# Altium integrated library controller.IntLib: 49 symbols
Pins are listed as number, name and electrical type; pins without a type are passive.

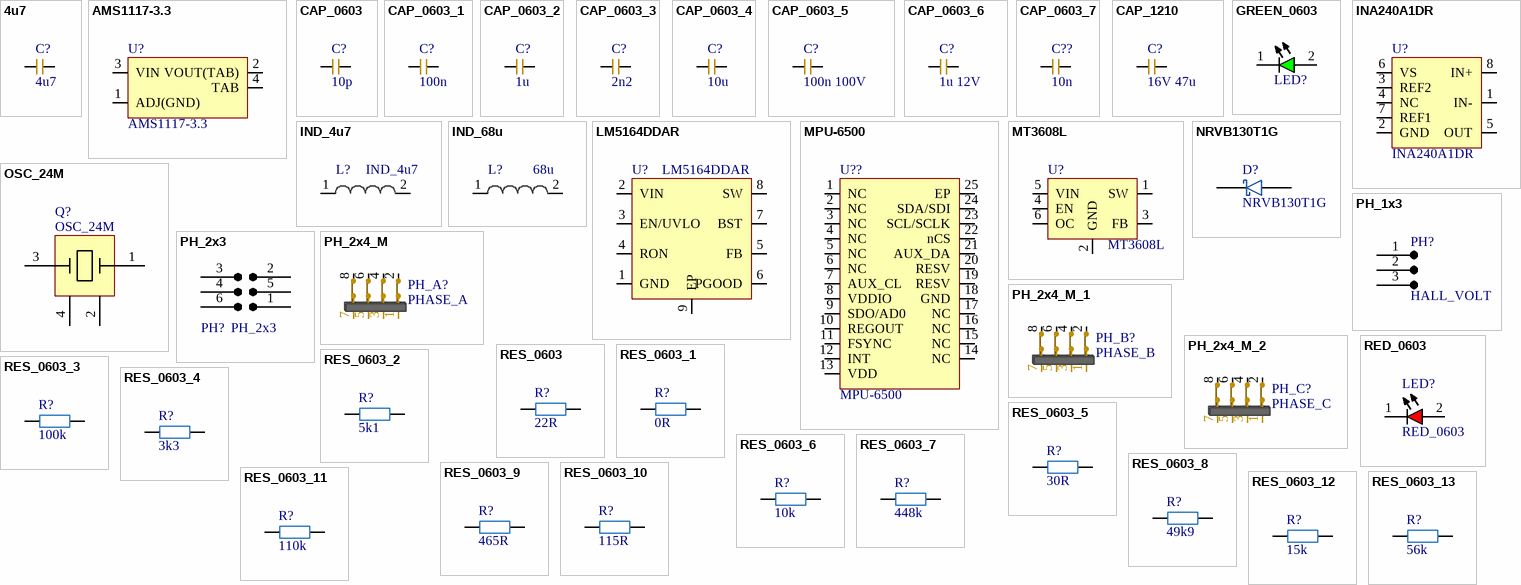
[diagram p0: symbols 4u7 to RES_0603_13]

## 4u7
designator C?
100V 4.7uF X7R ±10% 1210 Multilayer Ceramic Capacitors MLCC - SMD/SMT ROHS; Mfr.: PSA(Prosperity Dielectrics); Mfr. Part: FS32X475K101EGG; Voltage Rating: 100V; Package: 1210; LCSC: C381466; ClassName: DCDC100
footprint FS32X475K101EGG (100V 4.7uF X7R ±10% 1210 Multilayer Ceramic Capacitors MLCC - SMD/SMT ROHS)
pins: 1, 2

## AMS1117-3.3
designator U?
1A 60dB@(120Hz) Fixed 3.3V Positive electrode 12V SOT-223 Voltage Regulators - Linear, Low Drop Out (LDO) Regulators ROHS; Mfr.: UMW(Youtai Semiconductor Co., Ltd.); Mfr. Part: AMS1117-3.3; LCSC: C347222; ClassName: LINREG
footprint AMS1117-3.3 (1A 60dB@(120Hz) Fixed 3.3V Positive electrode 12V SOT-223 Voltage Regulators - Linear, Low Drop Out (LDO) Regulators ROHS)
pins: 1 ADJ(GND), 2 VOUT(TAB), 3 VIN, 4 TAB

## CAP_0603
designator C?, comment 10p
Multilayer Ceramic Capacitors MLCC - SMD/SMT ROHS; Mfr.: *; Voltage Rating: *; Package: 0603; LCSC: *; Mfr. Part: *
footprint CAP_0603
pins: 1, 2

## CAP_0603_1
designator C?, comment 100n
Multilayer Ceramic Capacitors MLCC - SMD/SMT ROHS; Mfr.: *; Voltage Rating: *; Package: 0603; LCSC: *; Mfr. Part: *
footprint CAP_0603
pins: 1, 2

## CAP_0603_2
designator C?, comment 1u
Multilayer Ceramic Capacitors MLCC - SMD/SMT ROHS; Mfr.: *; Voltage Rating: *; Package: 0603; LCSC: *; Mfr. Part: *
footprint CAP_0603
pins: 1, 2

## CAP_0603_3
designator C?, comment 2n2
Multilayer Ceramic Capacitors MLCC - SMD/SMT ROHS; Mfr.: *; Voltage Rating: *; Package: 0603; LCSC: *; Mfr. Part: *; ClassName: DCDC100
footprint CAP_0603
pins: 1, 2

## CAP_0603_4
designator C?, comment 10u
Multilayer Ceramic Capacitors MLCC - SMD/SMT ROHS; Mfr.: *; Voltage Rating: *; Package: 0603; LCSC: *; Mfr. Part: *; ClassName: LINREG
footprint CAP_0603
pins: 1, 2

## CAP_0603_5
designator C?, comment 100n 100V
Multilayer Ceramic Capacitors MLCC - SMD/SMT ROHS; Mfr.: *; Voltage Rating: *; Package: 0603; LCSC: *; Mfr. Part: *
footprint CAP_0603
pins: 1, 2

## CAP_0603_6
designator C?, comment 1u 12V
Multilayer Ceramic Capacitors MLCC - SMD/SMT ROHS; Mfr.: *; Voltage Rating: *; Package: 0603; LCSC: *; Mfr. Part: *
footprint CAP_0603
pins: 1, 2

## CAP_0603_7
designator C??, comment 10n
Multilayer Ceramic Capacitors MLCC - SMD/SMT ROHS; Mfr.: *; Voltage Rating: *; Package: 0603; LCSC: *; Mfr. Part: *
footprint CAP_0603
pins: 1, 2

## CAP_1210
designator C?, comment 16V 47u
16V 47uF X5R ±10% 1210 Multilayer Ceramic Capacitors MLCC - SMD/SMT ROHS; Mfr.: Murata Electronics; Mfr. Part: GRM32ER61C476KE15L; Voltage Rating: 16V; Package: 1210; LCSC: C77101; ClassName: DCDC100
footprint CAP_1210 (16V 47uF X5R ±10% 1210 Multilayer Ceramic Capacitors MLCC - SMD/SMT ROHS)
pins: 1, 2

## GREEN_0603
designator LED?  (value not drawn)
20mA 810mcd Colorless Transparent Lens Independent Diode 515nm~535nm -20℃~+85℃ Positive Stick Emerald 120° 70mW 3.3V 0603 LED Indication - Discrete ROHS; Mfr.: XINGLIGHT; Mfr. Part: XL-1608UGC-04; LCSC: C965804; Package: 0603
footprint GREEN_0603 (20mA 810mcd Colorless Transparent Lens Independent Diode 515nm~535nm -20?~+85? Positive Stick Emerald 120° 70mW 3.3V 0603 LED Indication - Discrete ROHS)
pins: 1 K, 2 A

## INA240A1DR
designator U?
-4V~80V Single channel SOIC-8 Current Sense Amplifiers ROHS; Mfr.: Texas Instruments; Mfr. Part: INA240A1DR; LCSC: C2060769
footprint INA240A1DR
pins: 1 IN-, 2 GND, 3 REF2, 4 NC, 5 OUT, 6 VS, 7 REF1, 8 IN+

## IND_4u7
designator L?
2A 4.7uH Integrated molded inductor ±20% 2.6A SMD,2x2.5mm Power Inductors ROHS; Mfr.: cjiang (Changjiang Microelectronics Tech); Mfr. Part: FTC252010S4R7MBCA; LCSC: C5832360; Package: SMD,2x2.5mm; ClassName: DCDC5
footprint FTC252010S4R7MBCA (2A 4.7uH Integrated molded inductor ±20% 2.6A SMD,2x2.5mm Power Inductors ROHS)
pins: 1, 2

## IND_68u
designator L?, comment 68u
1.5A 68uH Integrated molded inductor ±20% 2A SMD,6.6x7.1mm Power Inductors ROHS; Mfr.: SXN(Shun Xiang Nuo Elec); Mfr. Part: SMMS0650-680M; LCSC: C2894721; Package: SMD,6.6x7.1mm; ClassName: DCDC100
footprint SMMS0650-680M (1.5A 68uH Integrated molded inductor ±20% 2A SMD,6.6x7.1mm Power Inductors ROHS)
pins: 1, 2

## LM5164DDAR
designator U?
Step-down type 1A 6V~100V SO-8-EP DC-DC Converters ROHS; Mfr.: Texas Instruments; Mfr. Part: LM5164DDAR; LCSC: C477928; ClassName: DCDC100
footprint LM5164DDAR (Step-down type 1A 6V~100V SO-8-EP DC-DC Converters ROHS)
pins: 1 GND, 2 VIN, 3 EN/UVLO, 4 RON, 5 FB, 6 PGOOD, 7 BST, 8 SW, 9 EP

## MPU-6500
designator U??
Accelerometer gyroscope QFN-24-EP(3x3) Accelerometers ROHS; Mfr.: TDK InvenSense; LCSC: C50278; Mfr. Part: MPU-6500
footprint MPU-6500
pins: 1 NC, 2 NC, 3 NC, 4 NC, 5 NC, 6 NC, 7 AUX_CL, 8 VDDIO, 9 SDO/AD0, 10 REGOUT, 11 FSYNC, 12 INT, 13 VDD, 14 NC, 15 NC, 16 NC, 17 NC, 18 GND, 19 RESV, 20 RESV, 21 AUX_DA, 22 nCS, 23 SCL/SCLK, 24 SDA/SDI, 25 EP

## MT3608L
designator U?
2.2V~16V 2.5A SOT-23-6 DC-DC Converters ROHS; Mfr.: XI'AN Aerosemi Tech; Mfr. Part: MT3608L; LCSC: C2932326; ClassName: DCDC5
footprint MT3608L (2.2V~16V 2.5A SOT-23-6 DC-DC Converters ROHS)
pins: 1 SW, 2 GND, 3 FB, 4 EN, 5 VIN, 6 OC

## NRVB130T1G
designator D?
30V 1A 350mV@100mA SOD-123 Schottky Diodes ROHS; Mfr.: JSMSEMI; LCSC: C917121; Mfr. Part: NRVB130T1G; ClassName: DCDC5
footprint NRVB130T1G (30V 1A 350mV@100mA SOD-123 Schottky Diodes ROHS)
pins: 1, 2

## OSC_24M
designator Q?
Crystal 24Mhz; Manufacturer Part: X322524MOB4SI; LCSC: C70590; ComponentLink1Description: Datasheet; ComponentLink1URL: https://www.lcsc.com/datasheet/lcsc_datasheet_2403291504_YXC-Crystal-Oscillators-X322524MOB4SI_C70590.pdf
footprint OSC_24M (OT2EL4C4JI-111OLP-24M 24Mhz Crystal Oscillator)
pins: 1, 2, 3, 4

## PH_1x3
designator PH?, comment HALL_VOLT
2.54mm Pin Headers; Mfr. Part: 2.54-1*3P; Mfr.: BOOMELE(Boom Precision Elec); LCSC: C49257; Package: Plugin,P=2.54mm
footprint PH_1x3
pins: 1, 2, 3

## PH_2x3
designator PH?
2.54mm Pin Headers
footprint PH_2x3
pins: 1, 2, 3, 4, 5, 6

## PH_2x4_M
designator PH_A?, comment PHASE_A
Policy 2.5mm 8P 6mm -40℃~+105℃ 2.54mm Double Row Black Brass 2x4P Push-Pull,P=2.54mm Pin Headers ROHS; Mfr. Part: PH2.54-07-04PWS; Mfr.: XUNPU; LCSC: C7501618; ClassName: A
footprint PH_2x4_M
pins: 1, 2, 3, 4, 5, 6, 7, 8

## PH_2x4_M_1
designator PH_B?, comment PHASE_B
Policy 2.5mm 8P 6mm -40℃~+105℃ 2.54mm Double Row Black Brass 2x4P Push-Pull,P=2.54mm Pin Headers ROHS; Mfr. Part: PH2.54-07-04PWS; Mfr.: XUNPU; LCSC: C7501618; ClassName: B
footprint PH_2x4_M
pins: 1, 2, 3, 4, 5, 6, 7, 8

## PH_2x4_M_2
designator PH_C?, comment PHASE_C
Policy 2.5mm 8P 6mm -40℃~+105℃ 2.54mm Double Row Black Brass 2x4P Push-Pull,P=2.54mm Pin Headers ROHS; Mfr. Part: PH2.54-07-04PWS; Mfr.: XUNPU; LCSC: C7501618; ClassName: C
footprint PH_2x4_M
pins: 1, 2, 3, 4, 5, 6, 7, 8

## RED_0603
designator LED?
20mA 330mcd Colorless Transparent Lens -20℃~+85℃ Positive Stick 620nm~630nm Red 120° 50mW 2.3V 0603 LED Indication - Discrete ROHS; Mfr.: XINGLIGHT; Mfr. Part: XL-1608SURC-06; LCSC: C965799; Package: 0603
footprint RED_0603 (20mA 330mcd Colorless Transparent Lens -20?~+85? Positive Stick 620nm~630nm Red 120° 50mW 2.3V 0603 LED Indication - Discrete ROHS)
pins: 1 K, 2 A

## RES_0603
designator R?, comment 22R
100mW Thick Film Resistors; Voltage Rating: *; Mfr. Part: *; Package: 0603; LCSC: *; Mfr.: *
footprint RES_0603 (Chip Resistor, 2-Leads, Body 1,60x0,80mm, IPC Medium Density)
pins: 1, 2

## RES_0603_1
designator R?, comment 0R
100mW Thick Film Resistors; Voltage Rating: *; Mfr. Part: *; Package: 0603; LCSC: *; Mfr.: *
footprint RES_0603 (Chip Resistor, 2-Leads, Body 1,60x0,80mm, IPC Medium Density)
pins: 1, 2

## RES_0603_2
designator R?, comment 5k1
100mW Thick Film Resistors; Voltage Rating: *; Mfr. Part: *; Package: 0603; LCSC: *; Mfr.: *
footprint RES_0603 (Chip Resistor, 2-Leads, Body 1,60x0,80mm, IPC Medium Density)
pins: 1, 2

## RES_0603_3
designator R?, comment 100k
100mW Thick Film Resistors; Voltage Rating: *; Mfr. Part: *; Package: 0603; LCSC: *; Mfr.: *
footprint RES_0603 (Chip Resistor, 2-Leads, Body 1,60x0,80mm, IPC Medium Density)
pins: 1, 2

## RES_0603_4
designator R?, comment 3k3
100mW Thick Film Resistors; Voltage Rating: *; Mfr. Part: *; Package: 0603; LCSC: *; Mfr.: *
footprint RES_0603 (Chip Resistor, 2-Leads, Body 1,60x0,80mm, IPC Medium Density)
pins: 1, 2

## RES_0603_5
designator R?, comment 30R
100mW Thick Film Resistors; Voltage Rating: *; Mfr. Part: *; Package: 0603; LCSC: *; Mfr.: *
footprint RES_0603 (Chip Resistor, 2-Leads, Body 1,60x0,80mm, IPC Medium Density)
pins: 1, 2

## RES_0603_6
designator R?, comment 10k
100mW Thick Film Resistors; Voltage Rating: *; Mfr. Part: *; Package: 0603; LCSC: *; Mfr.: *
footprint RES_0603 (Chip Resistor, 2-Leads, Body 1,60x0,80mm, IPC Medium Density)
pins: 1, 2

## RES_0603_7
designator R?, comment 448k
100mW Thick Film Resistors; Voltage Rating: *; Mfr. Part: *; Package: 0603; LCSC: *; Mfr.: *; ClassName: DCDC100
footprint RES_0603 (Chip Resistor, 2-Leads, Body 1,60x0,80mm, IPC Medium Density)
pins: 1, 2

## RES_0603_8
designator R?, comment 49k9
100mW Thick Film Resistors; Voltage Rating: *; Mfr. Part: *; Package: 0603; LCSC: *; Mfr.: *; ClassName: DCDC100
footprint RES_0603 (Chip Resistor, 2-Leads, Body 1,60x0,80mm, IPC Medium Density)
pins: 1, 2

## RES_0603_9
designator R?, comment 465R
100mW Thick Film Resistors; Voltage Rating: *; Mfr. Part: *; Package: 0603; LCSC: *; Mfr.: *
footprint RES_0603 (Chip Resistor, 2-Leads, Body 1,60x0,80mm, IPC Medium Density)
pins: 1, 2

## RES_0603_10
designator R?, comment 115R
100mW Thick Film Resistors; Voltage Rating: *; Mfr. Part: *; Package: 0603; LCSC: *; Mfr.: *
footprint RES_0603 (Chip Resistor, 2-Leads, Body 1,60x0,80mm, IPC Medium Density)
pins: 1, 2

## RES_0603_11
designator R?, comment 110k
100mW Thick Film Resistors; Voltage Rating: *; Mfr. Part: *; Package: 0603; LCSC: *; Mfr.: *; ClassName: DCDC5
footprint RES_0603 (Chip Resistor, 2-Leads, Body 1,60x0,80mm, IPC Medium Density)
pins: 1, 2

## RES_0603_12
designator R?, comment 15k
100mW Thick Film Resistors; Voltage Rating: *; Mfr. Part: *; Package: 0603; LCSC: *; Mfr.: *; ClassName: DCDC5
footprint RES_0603 (Chip Resistor, 2-Leads, Body 1,60x0,80mm, IPC Medium Density)
pins: 1, 2

## RES_0603_13
designator R?, comment 56k
100mW Thick Film Resistors; Voltage Rating: *; Mfr. Part: *; Package: 0603; LCSC: *; Mfr.: *
footprint RES_0603 (Chip Resistor, 2-Leads, Body 1,60x0,80mm, IPC Medium Density)
pins: 1, 2

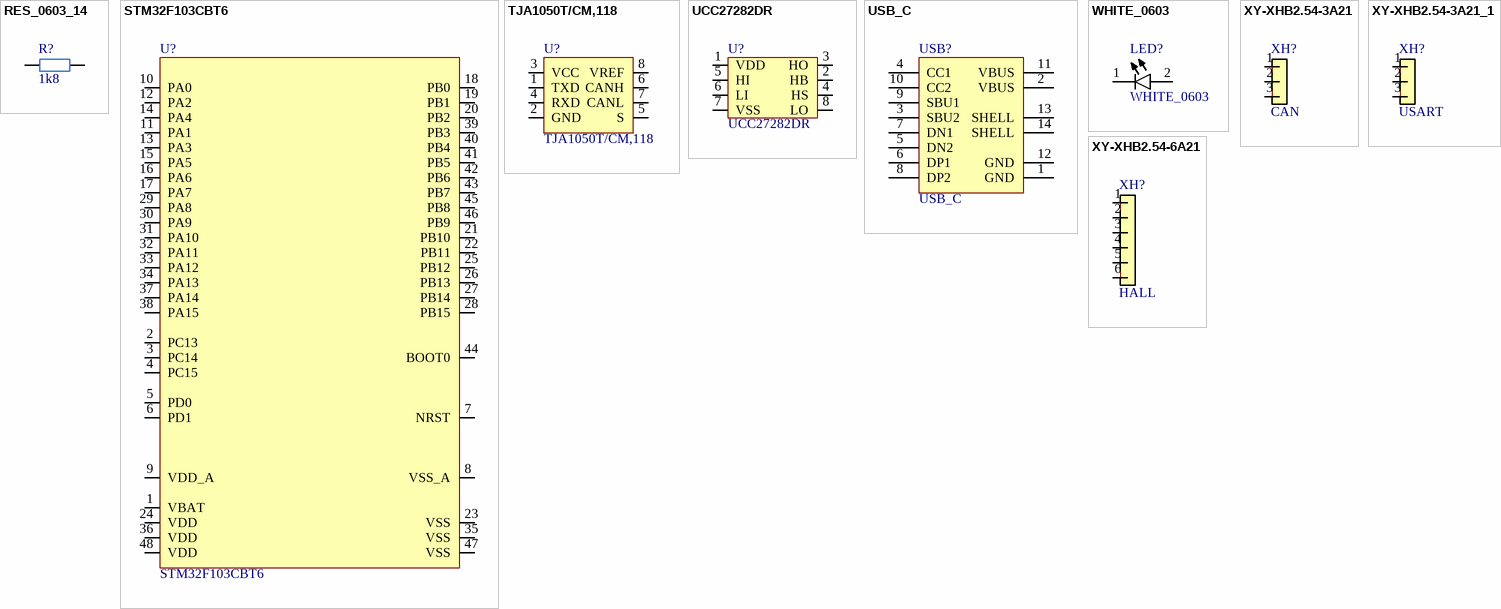
[diagram p1: symbols RES_0603_14 to XY-XHB2.54-6A21]

## RES_0603_14
designator R?, comment 1k8
100mW Thick Film Resistors; Voltage Rating: *; Mfr. Part: *; Package: 0603; LCSC: *; Mfr.: *
footprint RES_0603 (Chip Resistor, 2-Leads, Body 1,60x0,80mm, IPC Medium Density)
pins: 1, 2

## STM32F103CBT6
designator U?
Mainstream enhanced ARM Cortex-M3 MCU, featuring 128 KB Flash, 72 MHz CPU, motor control, USB, and CAN.; Mfr.: STMicroelectronics; Mfr. Part: STM32F103CBT6; LCSC: C8304
footprint STM32F103CBT6 (Mainstream enhanced ARM Cortex-M3 MCU, featuring 128 KB Flash, 72 MHz CPU, motor control, USB, and CAN.)
pins: 1 VBAT, 2 PC13, 3 PC14, 4 PC15, 5 PD0, 6 PD1, 7 NRST, 8 VSS_A, 9 VDD_A, 10 PA0, 11 PA1, 12 PA2, 13 PA3, 14 PA4, 15 PA5, 16 PA6, 17 PA7, 18 PB0, 19 PB1, 20 PB2, 21 PB10, 22 PB11, 23 VSS, 24 VDD, 25 PB12, 26 PB13, 27 PB14, 28 PB15, 29 PA8, 30 PA9, 31 PA10, 32 PA11, 33 PA12, 34 PA13, 35 VSS, 36 VDD, 37 PA14, 38 PA15, 39 PB3, 40 PB4, 41 PB5, 42 PB6, 43 PB7, 44 BOOT0, 45 PB8, 46 PB9, 47 VSS, 48 VDD

## TJA1050T/CM,118
designator U?
SOP-8 CAN Transceivers ROHS; Mfr.: NXP Semicon; Mfr. Part: TJA1050T/CM,118; LCSC: C6952
footprint TJA1050T/CM,118
pins: 1 TXD, 2 GND, 3 VCC, 4 RXD, 5 S, 6 CANH, 7 CANL, 8 VREF

## UCC27282DR
designator U?
Half Bridge 2 MOSFET 2.5A 12ns 10ns 5.5V~16V 3.5A SOIC-8 Gate Drivers ROHS; Mfr.: Texas Instruments; Mfr. Part: UCC27282DR; LCSC: C2867844
footprint UCC27282DR (Half Bridge 2 MOSFET 2.5A 12ns 10ns 5.5V~16V 3.5A SOIC-8 Gate Drivers ROHS)
pins: 1 VDD, 2 HB, 3 HO, 4 HS, 5 HI, 6 LI, 7 VSS, 8 LO

## USB_C
designator USB?
Mfr. Part: TYPE-C 16PIN 2MD(073); Mfr.: SHOU HAN; LCSC: C2765186; Package: SMD
footprint USB_C (TYPE-C 16PIN 2MD(073))
pins: 1 GND, 2 VBUS, 3 SBU2, 4 CC1, 5 DN2, 6 DP1, 7 DN1, 8 DP2, 9 SBU1, 10 CC2, 11 VBUS, 12 GND, 13 SHELL, 14 SHELL

## WHITE_0603
designator LED?
20mA 780mcd Yellow lens -20℃~+85℃ Positive Stick White 130° 70mW 3.3V 0603 LED Indication - Discrete ROHS; Mfr.: XINGLIGHT; Mfr. Part: XL-1608WWC-06; LCSC: C965810; Package: 0603
footprint WHITE_0603 (20mA 780mcd Yellow lens -20?~+85? Positive Stick White 130° 70mW 3.3V 0603 LED Indication - Discrete ROHS)
pins: 1 K, 2 A

## XY-XHB2.54-3A21
designator XH?, comment CAN
1x3P 3P 1 2.54mm 2.54mm 3 -25℃~+85℃ 2A Bend-in Push-Pull,P=2.54mm Wire To Board Connector ROHS; Mfr. Part: XY-XHB2.54-3A21; Mfr.: XYECONN; LCSC: C19271396
footprint XY-XHB2.54-3A21 (1x3P 3P 1 2.54mm 2.54mm 3 -25?~+85? 2A Bend-in Push-Pull,P=2.54mm Wire To Board Connector ROHS)
pins: 1, 2, 3

## XY-XHB2.54-3A21_1
designator XH?, comment USART
1x3P 3P 1 2.54mm 2.54mm 3 -25℃~+85℃ 2A Bend-in Push-Pull,P=2.54mm Wire To Board Connector ROHS; Mfr. Part: XY-XHB2.54-3A21; Mfr.: XYECONN; LCSC: C19271396
footprint XY-XHB2.54-3A21 (1x3P 3P 1 2.54mm 2.54mm 3 -25?~+85? 2A Bend-in Push-Pull,P=2.54mm Wire To Board Connector ROHS)
pins: 1, 2, 3

## XY-XHB2.54-6A21
designator XH?, comment HALL
1x6P 6P 1 2.54mm 2.54mm 6 -25℃~+85℃ 2A Bend-in Push-Pull,P=2.54mm Wire To Board Connector ROHS; Mfr. Part: XY-XHB2.54-6A21; Mfr.: XYECONN; LCSC: C19271399
footprint XY-XHB2.54-6A21 (1x6P 6P 1 2.54mm 2.54mm 6 -25?~+85? 2A Bend-in Push-Pull,P=2.54mm Wire To Board Connector ROHS)
pins: 1, 2, 3, 4, 5, 6